# Altium footprint library PcbLib1.PcbLib: 136 footprints (part 5 of 9)
Each footprint in its own frame and in the unit in brackets; x right, y up, seen from the top. Pads: shape width x height; smd on the part's side, far side on the other; paste and mask are expansions set on the pad; w line width, h text height; cw(c..) or ccw(c..) is an arc to the next point about the centre after c.
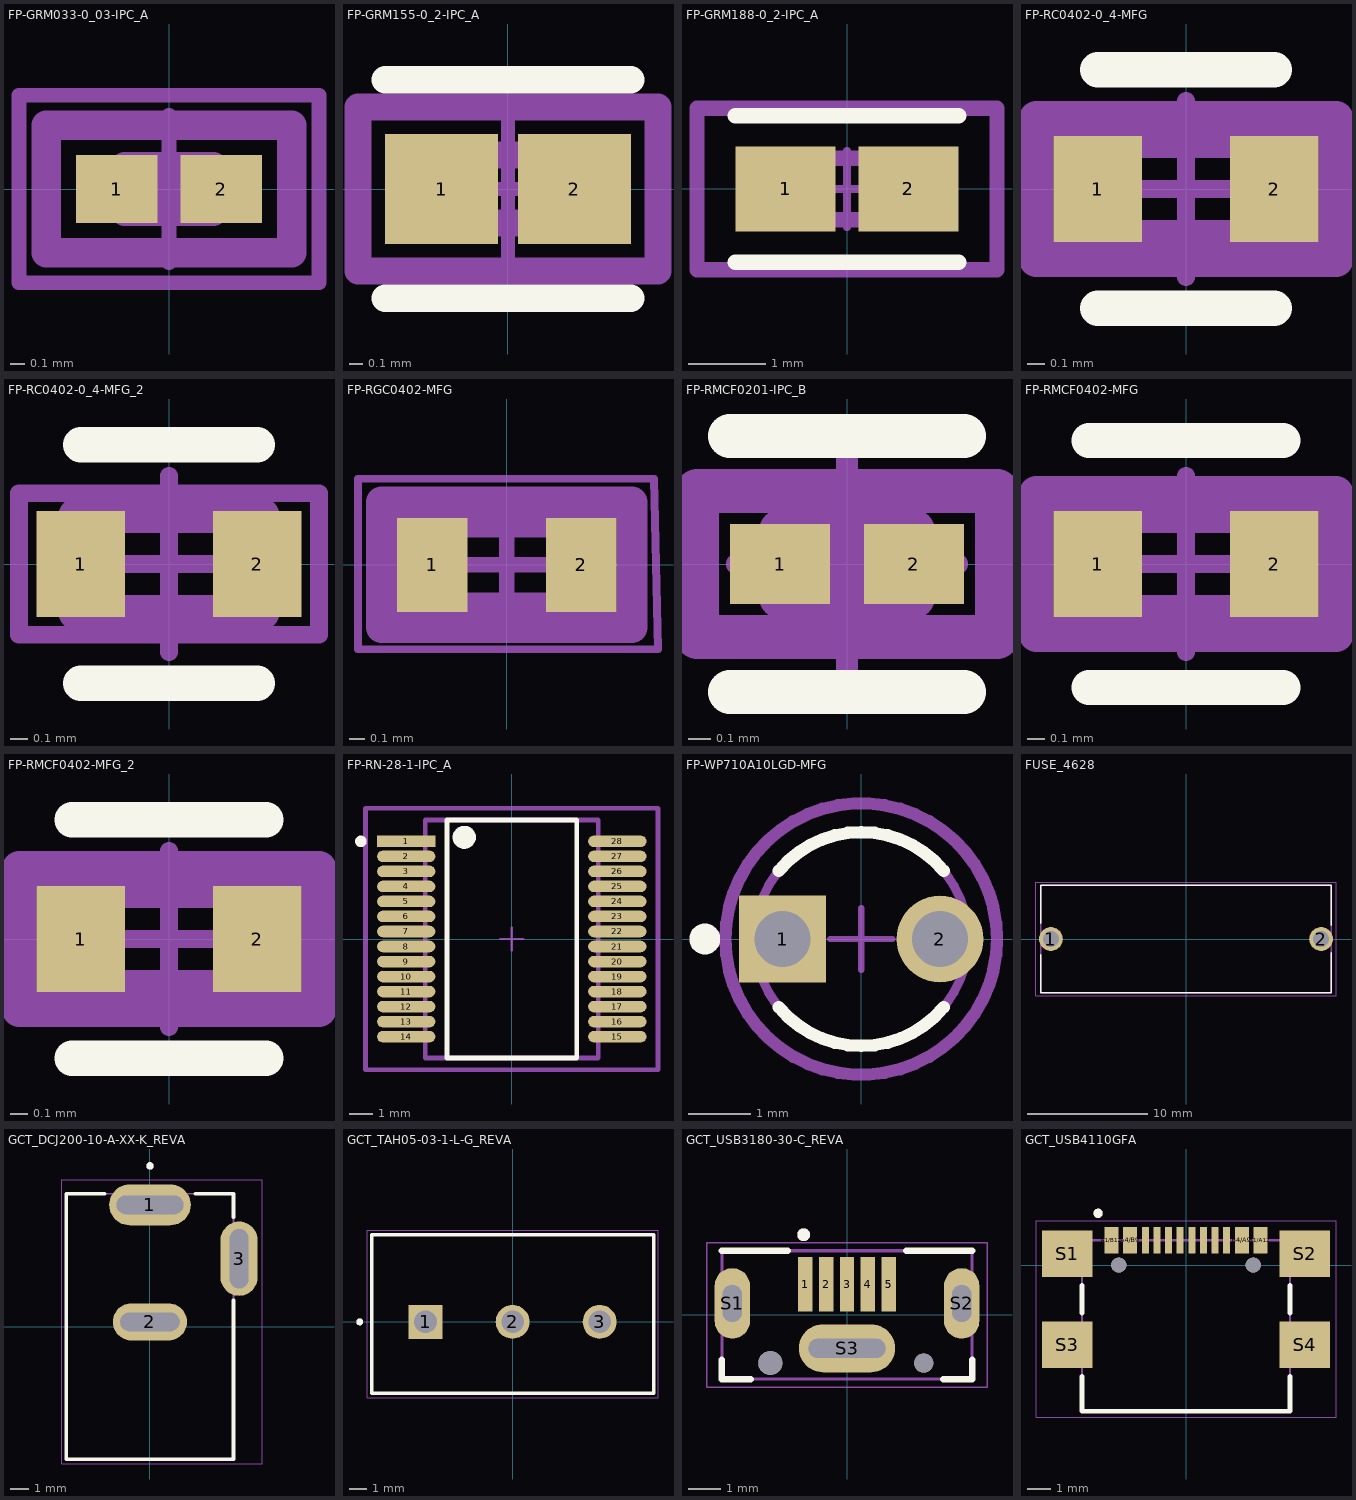
[diagram p4: the footprints below, top view; thin cyan lines are the x and y axes]

## FP-GRM033-0_03-IPC_A [mm]
pads (2):
  rect 0.554x0.463 smd paste+0 mask+0: 1(-0.354,0) 2(0.354,0)
Top Courtyard:
  lines w0.2: -0.831,-0.431 -0.831,0.431 0.831,0.431 0.831,-0.431 -0.831,-0.431
Top 3D Body:
  lines w0.2: -0.3,-0.15 -0.3,0.15 0.3,0.15 0.3,-0.15 -0.3,-0.15
Top Assembly:
  lines w0.2: -0.831,-0.431 -0.831,0.431 0.831,0.431 0.831,-0.431 -0.831,-0.431
  text ".Designator" at 0,0.024 h0.13
Mechanical 15:
  lines w0.101: -1.016,-0.635 -1.016,0.635 1.016,0.635 1.016,-0.635 -1.016,-0.635
Top Component Center:
  lines w0.1: -0.5,0 0.5,0 ; 0,-0.5 0,0.5
3D body "Cap_Murata_GRM0335C1HR30BA01D_eec.STEP": height 0.25, standoff 0, extent -0.831,-0.431 0.831,0.431

## FP-GRM155-0_2-IPC_A [mm]
pads (2):
  rect 0.828x0.806 smd paste+0 mask+0: 1(-0.489,0) 2(0.489,0)
Top Overlay:
  lines w0.2: -0.903,-0.803 0.903,-0.803 ; -0.903,0.803 0.903,0.803
Top Courtyard:
  lines w0.2: -1.103,-0.603 1.103,-0.603 1.103,0.603 -1.103,0.603 -1.103,-0.603
Top 3D Body:
  lines w0.2: -0.5,-0.25 0.5,-0.25 0.5,0.25 -0.5,0.25 -0.5,-0.25
Top Assembly:
  lines w0.2: -1.103,-0.603 1.103,-0.603 1.103,0.603 -1.103,0.603 -1.103,-0.603
  text ".Designator" at 0,0.024 h0.13
Top Component Center:
  lines w0.1: -0.5,0 0.5,0 ; 0,-0.5 0,0.5
3D body "Cap_Murata_GRM155R61E225KE11D_eec.STEP": height 0.25, standoff 0, extent -1.103,-0.603 1.103,0.603

## FP-GRM188-0_2-IPC_A [mm]
pads (2):
  rect 1.305x1.106 smd paste+0 mask+0: 1(-0.801,0) 2(0.801,0)
Top Overlay:
  lines w0.2: -1.453,-0.953 1.453,-0.953 ; -1.453,0.953 1.453,0.953
Top Courtyard:
  lines w0.2: -1.953,-1.053 -1.953,1.053 1.953,1.053 1.953,-1.053 -1.953,-1.053
Top 3D Body:
  lines w0.2: -0.8,-0.4 -0.8,0.4 0.8,0.4 0.8,-0.4 -0.8,-0.4
Top Assembly:
  lines w0.2: -1.953,-1.053 -1.953,1.053 1.953,1.053 1.953,-1.053 -1.953,-1.053
  text ".Designator" at 0,0.024 h0.13
Top Component Center:
  lines w0.1: -0.5,0 0.5,0 ; 0,-0.5 0,0.5
3D body "Cap_Murata_GRM188C71C225KE11D_eec.STEP": height 0.25, standoff 0, extent -1.953,-1.053 1.953,1.053

## FP-RC0402-0_4-MFG [mm]
pads (2):
  rect 0.5x0.6 smd paste+0 mask+0: 1(-0.5,0) 2(0.5,0)
Top Overlay:
  lines w0.2: -0.5,-0.675 0.5,-0.675 ; -0.5,0.675 0.5,0.675
Top Courtyard:
  lines w0.2: -0.85,-0.4 -0.85,0.4 0.85,0.4 0.85,-0.4 -0.85,-0.4
Top 3D Body:
  lines w0.2: -0.525,-0.275 -0.525,0.275 0.525,0.275 0.525,-0.275 -0.525,-0.275
Top Assembly:
  lines w0.2: -0.85,-0.4 -0.85,0.4 0.85,0.4 0.85,-0.4 -0.85,-0.4
  text ".Designator" at 0,0.024 h0.13
Top Component Center:
  lines w0.1: -0.5,0 0.5,0 ; 0,-0.5 0,0.5
3D body "Res_Yageo_RC0402FR-07187KL_eec.STEP": height 0.25, standoff 0, extent -0.85,-0.4 0.85,0.4

## FP-RC0402-0_4-MFG_2 [mm]
pads (2):
  rect 0.5x0.6 smd: 1(-0.5,0) 2(0.5,0)
Top Overlay:
  lines w0.2: -0.5,-0.675 0.5,-0.675 ; -0.5,0.675 0.5,0.675
Top Courtyard:
  lines w0.1: -0.85,-0.4 -0.85,0.4 0.85,0.4 0.85,-0.4 -0.85,-0.4
Top 3D Body:
  lines w0.2: -0.525,-0.275 -0.525,0.275 0.525,0.275 0.525,-0.275 -0.525,-0.275
Top Assembly:
  text ".Designator" at 0,0.024 h0.13
Top Component Center:
  lines w0.1: -0.5,0 0.5,0 ; 0,-0.5 0,0.5
3D body "Res_Yageo_RC0402FR-072R2L_eec.STEP": height 0.25, standoff 0, extent -0.85,-0.4 0.85,0.4

## FP-RGC0402-MFG [mm]
pads (2):
  rect 0.45x0.6 smd paste+0 mask+0: 1(-0.475,0) 2(0.475,0)
Top Courtyard:
  lines w0.2: -0.8,-0.4 0.8,-0.4 0.8,0.4 -0.8,0.4 -0.8,-0.4
Top 3D Body:
  lines w0.2: -0.55,-0.275 -0.55,0.275 0.55,0.275 0.55,-0.275 -0.55,-0.275
Top Assembly:
  lines w0.2: -0.8,-0.4 0.8,-0.4 0.8,0.4 -0.8,0.4 -0.8,-0.4
  text ".Designator" at -0.45,-0.187 h0.2
Mechanical 15:
  lines w0.05: -0.95,-0.539 0.966,-0.539 0.94,0.55 -0.95,0.55 -0.95,-0.539
Top Component Center:
  lines w0.1: -0.5,0 0.5,0 ; 0,-0.425 0,0.425
3D body "Res_Stackpole_Electronics_RGC0402DTC10K0_eec.STEP": height 0.25, standoff 0, extent -0.8,-0.4 0.8,0.4

## FP-RMCF0201-IPC_B [mm]
pads (2):
  rect 0.454x0.363 smd paste+0 mask+0: 1(-0.304,0) 2(0.304,0)
Top Overlay:
  lines w0.2: -0.531,-0.581 0.531,-0.581 ; -0.531,0.581 0.531,0.581
Top Courtyard:
  lines w0.2: -0.681,-0.331 -0.681,0.331 0.681,0.331 0.681,-0.331 -0.681,-0.331
Top 3D Body:
  lines w0.2: -0.3,-0.15 -0.3,0.15 0.3,0.15 0.3,-0.15 -0.3,-0.15
Top Assembly:
  lines w0.2: -0.681,-0.331 -0.681,0.331 0.681,0.331 0.681,-0.331 -0.681,-0.331
  text ".Designator" at 0,0.024 h0.13
Top Component Center:
  lines w0.1: -0.5,0 0.5,0 ; 0,-0.5 0,0.5
3D body "Res_Stackpole_Electronics_RMCF0201JT1K00_eec.STEP": height 0.26, standoff 0, extent -0.3,-0.15 0.3,0.15

## FP-RMCF0402-MFG [mm]
pads (2):
  rect 0.5x0.6 smd paste+0 mask+0: 1(-0.5,0) 2(0.5,0)
Top Overlay:
  lines w0.2: -0.55,-0.7 0.55,-0.7 ; -0.55,0.7 0.55,0.7
Top Courtyard:
  lines w0.2: -0.85,-0.4 -0.85,0.4 0.85,0.4 0.85,-0.4 -0.85,-0.4
Top 3D Body:
  lines w0.2: -0.55,-0.275 -0.55,0.275 0.55,0.275 0.55,-0.275 -0.55,-0.275
Top Assembly:
  lines w0.2: -0.85,-0.4 -0.85,0.4 0.85,0.4 0.85,-0.4 -0.85,-0.4
  text ".Designator" at 0,0.024 h0.13
Top Component Center:
  lines w0.1: -0.5,0 0.5,0 ; 0,-0.5 0,0.5
3D body "Res_Stackpole_Electronics_RMCF0402FT1K00_eec.STEP": height 0.4, standoff 0, extent -0.5,-0.25 0.5,0.25

## FP-RMCF0402-MFG_2 [mm]
pads (2):
  rect 0.5x0.6 smd paste+0 mask+0: 1(-0.5,0) 2(0.5,0)
Top Overlay:
  lines w0.2: -0.55,-0.675 0.55,-0.675 ; -0.55,0.675 0.55,0.675
Top Courtyard:
  lines w0.2: -0.85,-0.4 0.85,-0.4 0.85,0.4 -0.85,0.4 -0.85,-0.4
Top 3D Body:
  lines w0.2: -0.55,-0.275 0.55,-0.275 0.55,0.275 -0.55,0.275 -0.55,-0.275
Top Assembly:
  lines w0.2: -0.85,-0.4 0.85,-0.4 0.85,0.4 -0.85,0.4 -0.85,-0.4
  text ".Designator" at 0,0.024 h0.13
Top Component Center:
  lines w0.1: -0.5,0 0.5,0 ; 0,-0.5 0,0.5
3D body "Res_Stackpole_RMCF0402FT1K07_eec.STEP": height 0.25, standoff 0, extent -0.85,-0.4 0.85,0.4

## FP-RN-28-1-IPC_A [mm]
pads (28):
  rect 2.523x0.5 smd paste+0 mask+0: 1(-4.566,4.225)
  rrect100% 2.523x0.5 smd paste+0 mask+0: 2(-4.566,3.575) 3(-4.566,2.925) 4(-4.566,2.275) 5(-4.566,1.625) 6(-4.566,0.975) 7(-4.566,0.325) 8(-4.566,-0.325) 9(-4.566,-0.975) 10(-4.566,-1.625) 11(-4.566,-2.275) 12(-4.566,-2.925) 13(-4.566,-3.575) 14(-4.566,-4.225) 15(4.566,-4.225) 16(4.566,-3.575) 17(4.566,-2.925) 18(4.566,-2.275) 19(4.566,-1.625) 20(4.566,-0.975) 21(4.566,-0.325) 22(4.566,0.325) 23(4.566,0.975) 24(4.566,1.625) 25(4.566,2.275) 26(4.566,2.925) 27(4.566,3.575) 28(4.566,4.225)
Top Overlay:
  circle w0.5: c-2.054,4.4 r0.25
  circle w0.25: c-6.527,4.225 r0.125
  lines w0.2: -2.804,-5.15 2.804,-5.15 2.804,5.15 -2.804,5.15 -2.804,-5.15
Top Courtyard:
  lines w0.2: -6.327,-5.65 6.327,-5.65 6.327,5.65 -6.327,5.65 -6.327,-5.65
Top 3D Body:
  lines w0.2: -3.75,-5.15 3.75,-5.15 3.75,5.15 -3.75,5.15 -3.75,-5.15
Top Assembly:
  lines w0.2: -6.327,-5.65 6.327,-5.65 6.327,5.65 -6.327,5.65 -6.327,-5.65
  text ".Designator" at -2.032,1.331 h1
Top Component Center:
  lines w0.1: -0.5,0 0.5,0 ; 0,-0.5 0,0.5
3D body "IC_Analog_Devices_ADM2867EBRNZ_eec.STEP": height 0.25, standoff 0, extent -6.327,-5.65 6.327,5.65

## FP-WP710A10LGD-MFG [mm]
pads (2):
  rect 1.4x1.4 hole 0.9 paste-2539.97 mask+0: 1(-1.27,0)
  round 1.4 hole 0.9 paste-2539.97 mask+0: 2(1.27,0)
Top Overlay:
  circle w0.25: c-2.525,0 r0.125
  lines w0.2: -1.329,-1.1 ccw(c0,0) 1.329,-1.1 ; -1.329,1.1 cw(c0,0) 1.329,1.1
Top Courtyard:
  lines w0.2: -2.191,0 ccw(c0,0) 2.191,0 ccw(c0,0) -2.191,0
Top 3D Body:
  circle w0.15: c0,0 r1.725
Top Assembly:
  text ".Designator" at -1.025,0.795 h0.51
Top Component Center:
  lines w0.1: -0.5,0 0.5,0 ; 0,-0.5 0,0.5
3D body "Diode_Kingbright_WP710A10LGD_eec.STEP": height 0.25, standoff 0, extent -2.191,-2.191 2.191,2.191

## FUSE_4628 [mm]
height 11.99
pads (2):
  round 1.98 hole 1.32: 1(-11.25,0) 2(11.25,0)
Top Overlay:
  lines w0.127: -12.105,-1.32 -12.105,-4.495 12.105,-4.495 12.105,-1.15 ; -12.105,1.32 -12.105,4.495 12.105,4.495 12.105,1.15
Mechanical 13:
  lines w0.127: -12.105,-4.495 12.105,-4.495 12.105,4.495 -12.105,4.495 -12.105,-4.495
Mechanical 15:
  lines w0.05: -12.49,-4.745 12.49,-4.745 12.49,4.745 -12.49,4.745 -12.49,-4.745
3D body "step_temp.STEP": height 11.99, standoff -3.96, extent -12.103,-4.496 12.103,4.496

## GCT_DCJ200-10-A-XX-K_REVA [mm]
height 11
pads (3):
  oval 4.4x2.2 hole 1 slot 3.6 at 0 deg: 1(0,6.55)
  oval 4x2 hole 1 slot 3.2 at 0 deg: 2(0,0.25)
  oval 2x4 hole 1 slot 3.2 at 90 deg: 3(4.8,3.65)
Top Overlay:
  circle w0.2: c0,8.65 r0.1
  lines w0.2: -2.45,7.15 -4.5,7.15 -4.5,-7.15 4.5,-7.15 4.5,1.4 ; 2.45,7.15 4.5,7.15 4.5,5.9
Mechanical 13:
  circle w0.2: c0,8.65 r0.1
  lines w0.1: -4.5,-7.15 4.5,-7.15 4.5,7.15 -4.5,7.15 -4.5,-7.15
Mechanical 15:
  lines w0.05: -4.75,-7.4 -4.75,7.9 6.05,7.9 6.05,-7.4 -4.75,-7.4
3D body "step_temp.STEP": height 11, standoff -3.5, extent -4.5,-7.15 5.05,7.15

## GCT_TAH05-03-1-L-G_REVA [mm]
height 12.7
pads (3):
  rect 1.95x1.95 / inner round 1.95 / far side rect 1.95x1.95 hole 1.3: 1(-5,0)
  round 1.95 hole 1.3: 2(0,0) 3(5,0)
Top Overlay:
  circle w0.2: c-8.78,0 r0.1
  lines w0.2: -8.1,-4.1 -8.1,5 8.1,5 8.1,-4.1 -8.1,-4.1
Mechanical 13:
  circle w0.2: c-8.78,0 r0.1
  lines w0.1: -8.1,-4.1 -8.1,5 8.1,5 8.1,-4.1 -8.1,-4.1
Mechanical 15:
  lines w0.05: -8.35,-4.35 -8.35,5.25 8.35,5.25 8.35,-4.35 -8.35,-4.35

## GCT_USB3180-30-C_REVA [mm]
pads (10):
  rect 0.45x1.7 smd: 1(-1.3,0.96) 2(-0.65,0.96) 3(0,0.96) 4(0.65,0.96) 5(1.3,0.96)
  oval 1.1x2.2 hole 0.6 slot 1.15 at 90 deg: S1(-3.575,0.36) S2(3.575,0.36)
  oval 3x1.5 hole 0.6 slot 2.4 at 0 deg: S3(0,-1.04)
  round 0.75 hole 0.75 unplated: ""(-2.39,-1.5)
  round 0.6 hole 0.6 unplated: ""(2.39,-1.5)
Top Overlay:
  circle w0.2: c-1.35,2.5 r0.1
  lines w0.2: -3.9,-1.39 -3.9,-2 -3,-2 ; -3.9,2 -1.85,2 ; 1.85,2 3.9,2 ; 3,-2 3.9,-2 3.9,-1.39
Top Courtyard:
  lines w0.05: -4.375,-2.25 -4.375,2.25 4.375,2.25 4.375,-2.25 -4.375,-2.25
Top 3D Body:
  circle w0.2: c-1.35,2.5 r0.1
  lines w0.1: -3.9,-2 -3.9,2 3.9,2 3.9,-2 -3.9,-2

## GCT_USB4110GFA [mm]
pads (18):
  rect 0.6x1.15 smd: A1/B12(-3.2,1.075) A4/B9(-2.4,1.075) B1/A12(3.2,1.075) B4/A9(2.4,1.075)
  rect 0.3x1.15 smd: A5(-1.25,1.075) A6(-0.25,1.075) A7(0.25,1.075) A8(1.25,1.075) B5(1.75,1.075) B6(0.75,1.075) B7(-0.75,1.075) B8(-1.75,1.075)
  rect 2.18x2 smd: S1(-5.11,0.5) S2(5.11,0.5) S3(-5.11,-3.43) S4(5.11,-3.43)
  round 0.65 hole 0.65 unplated: ""(-2.89,0) ""(2.89,0)
Top Overlay:
  circle w0.2: c-3.78,2.23 r0.1
  lines w0.2: -4.47,-4.79 -4.47,-6.28 4.47,-6.28 4.47,-4.79 ; -4.47,-2.07 -4.47,-0.86 ; 4.47,-2.07 4.47,-0.86
Mechanical 13:
  circle w0.2: c-3.78,2.23 r0.1
  lines w0.1: -4.47,-6.28 -4.47,1.07 4.47,1.07 4.47,-6.28 -4.47,-6.28
Mechanical 15:
  lines w0.05: -6.45,-6.53 6.45,-6.53 6.45,1.9 -6.45,1.9 -6.45,-6.53
3D body "step_temp.STEP": height 3.26, standoff -0.63, extent -5.65,-6.28 5.65,1.42